# Altium footprint library pcb.PcbLib: 397 footprints (part 11 of 25)
Each footprint in its own frame and in the unit in brackets; x right, y up, seen from the top. Pads: shape width x height; smd on the part's side, far side on the other; paste and mask are expansions set on the pad; w line width, h text height; cw(c..) or ccw(c..) is an arc to the next point about the centre after c.
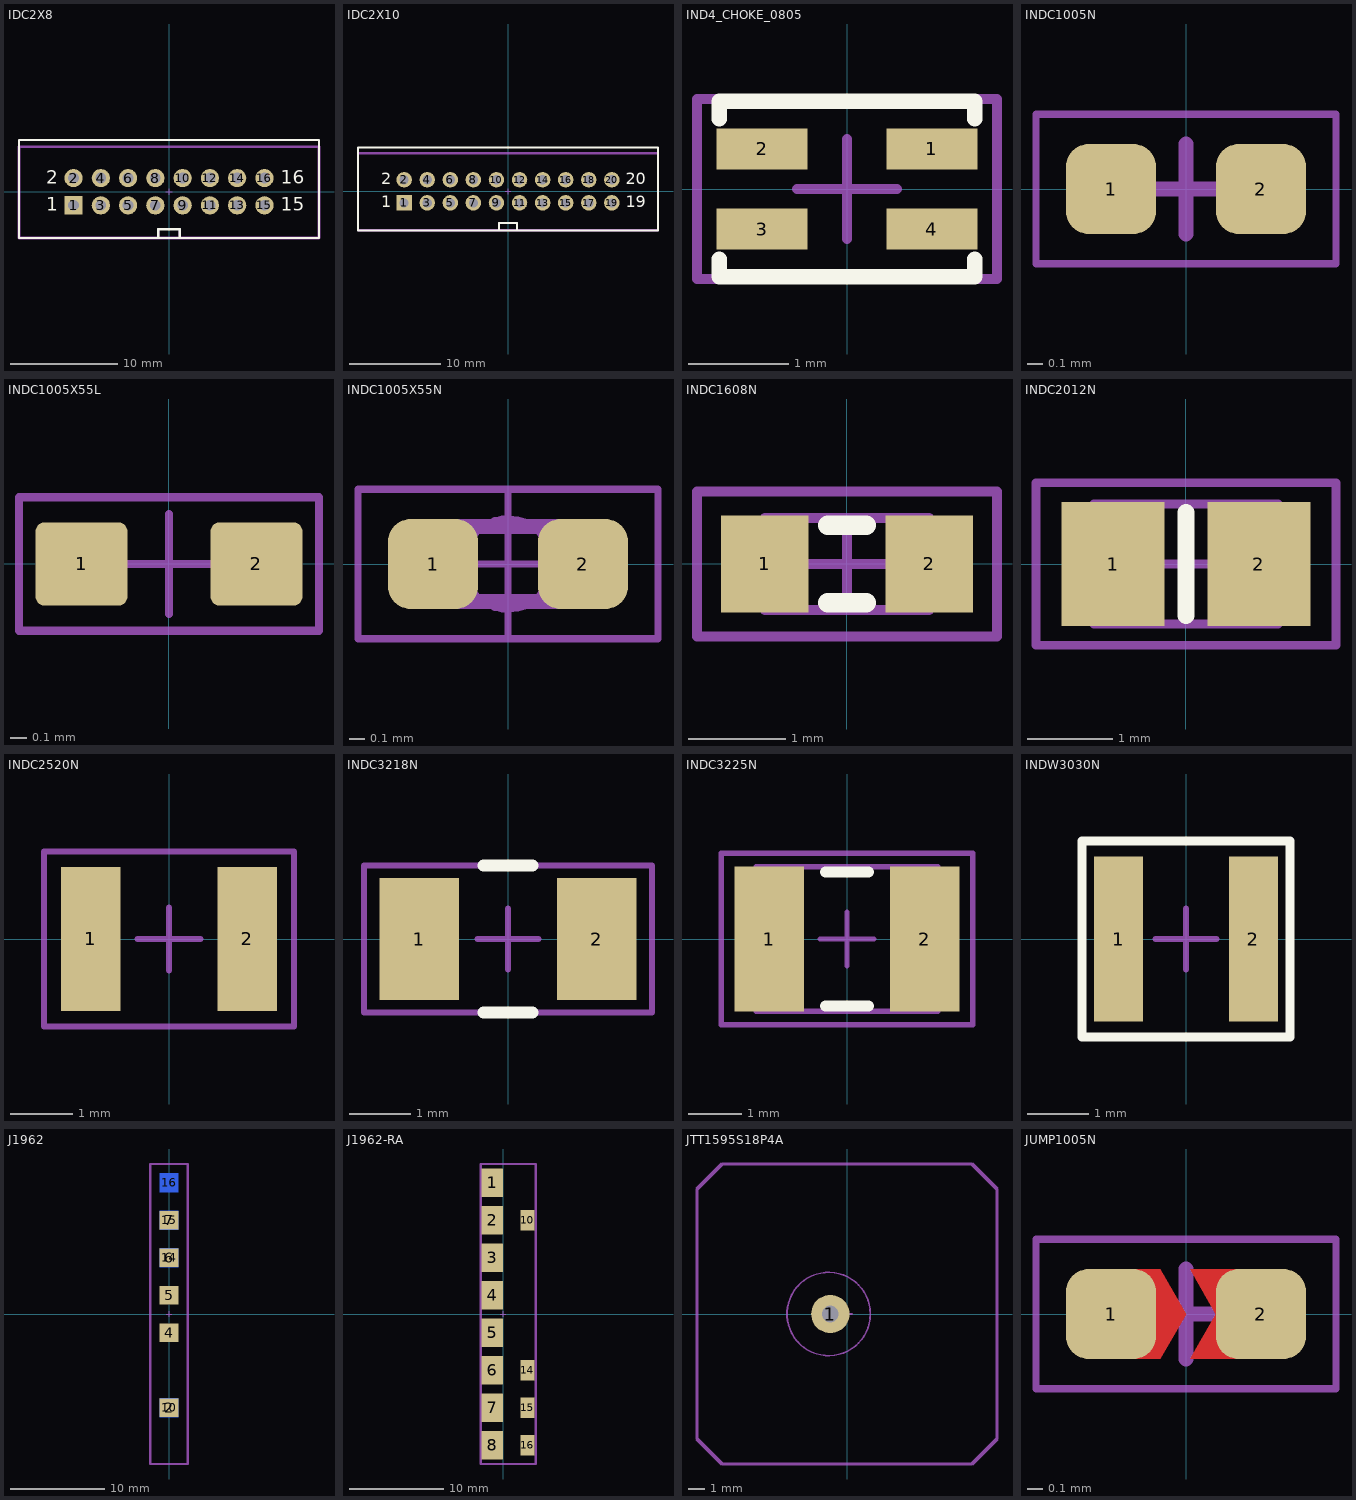
[diagram p10: the footprints below, top view; thin cyan lines are the x and y axes]

## IDC2X8 [mm] "Connector; Header; 8x2 Position"
pads (16):
  rect 1.7x1.7 hole 1: 1(-8.89,-1.27)
  round 1.7 hole 1: 2(-8.89,1.27) 3(-6.35,-1.27) 4(-6.35,1.27) 5(-3.81,-1.27) 6(-3.81,1.27) 7(-1.27,-1.27) 8(-1.27,1.27) 9(1.27,-1.27) 10(1.27,1.27) 11(3.81,-1.27) 12(3.81,1.27) 13(6.35,-1.27) 14(6.35,1.27) 15(8.89,-1.27) 16(8.89,1.27)
Top Overlay:
  lines w0.2: -1,-4.318 -1,-3.5 1,-3.5 1,-4.318 ; -13.97,-4.318 13.97,-4.318 13.97,4.826 -13.97,4.826 -13.97,-4.318
  text "2" at -11.43,0.762 h1.27
  text "1" at -11.43,-1.778 h1.27
  text "15" at 10.414,-1.778 h1.27
  text "16" at 10.414,0.762 h1.27
Mechanical 15:
  lines w0.1: -0.3,0 0.3,0 ; 0,-0.3 0,0.3
  lines w0.2: -1,-4.3 -1,-3.482 1,-3.482 1,-4.3
  lines w0.254: -13.97,-4.3 13.97,-4.3 13.97,4.2 -13.97,4.2 -13.97,-4.3
  text ".Designator" at 2.3,1.7 h1.02
  text "1" at -8.96,-1.7 h1.02
3D body "Samtec-TST-108-01-T-D.step": height 9.27, standoff -2.92, extent -13.97,-4.483 13.97,4.991

## IDC2X10 [mm] "Connector; Header; 10x2 Position"
pads (20):
  rect 1.7x1.7 hole 1: 1(-11.43,-1.27)
  round 1.7 hole 1: 2(-11.43,1.27) 3(-8.89,-1.27) 4(-8.89,1.27) 5(-6.35,-1.27) 6(-6.35,1.27) 7(-3.81,-1.27) 8(-3.81,1.27) 9(-1.27,-1.27) 10(-1.27,1.27) 11(1.27,-1.27) 12(1.27,1.27) 13(3.81,-1.27) 14(3.81,1.27) 15(6.35,-1.27) 16(6.35,1.27) 17(8.89,-1.27) 18(8.89,1.27) 19(11.43,-1.27) 20(11.43,1.27)
Top Overlay:
  lines w0.2: -1,-4.318 -1,-3.5 1,-3.5 1,-4.318 ; -16.51,-4.318 -16.51,4.826 16.51,4.826 16.51,-4.318 -16.51,-4.318
  text "20" at 12.954,0.762 h1.27
  text "19" at 12.954,-1.778 h1.27
  text "1" at -13.97,-1.778 h1.27
  text "2" at -13.97,0.762 h1.27
Mechanical 15:
  lines w0.1: -0.3,0 0.3,0 ; 0,-0.3 0,0.3
  lines w0.2: -1,-4.3 -1,-3.482 1,-3.482 1,-4.3
  lines w0.254: -16.51,-4.3 -16.51,4.2 16.51,4.2 16.51,-4.3 -16.51,-4.3
  text "1" at -11.5,-1.7 h1.02
  text ".Designator" at 2.3,1.7 h1.02
3D body "TST-110-01-X-D.step": height 9.27, standoff -2.92, extent -16.51,-4.572 16.51,4.902

## IND4_CHOKE_0805 [mil] "IND4_CHOKE_0805"
pads (4):
  rect 36x16 smd: 1(33.46,15.75) 2(-33.46,15.75) 3(-33.46,-15.75) 4(33.46,-15.75)
Top Overlay:
  lines w6: -50.31,-27.56 -50.31,-34.56 50.31,-34.56 50.31,-27.56 ; -50.31,27.56 -50.31,34.56 50.31,34.56 50.31,27.56
Mechanical 15:
  lines w3.94: -19.69,0 19.68,0 ; 0,-19.69 0,19.68 ; -59.06,-35.43 59.06,-35.43 59.06,35.43 -59.06,35.43 -59.06,-35.43
  text ".Designator" at -51.18,-27.56 h30
3D body: height 39.37, standoff 0, extent -51.46,-27.56 51.46,27.56

## INDC1005N [mm] "Chip Inductor, Body 1.0x0.5mm, IPC Medium Density"
height 0.6
pads (2):
  rrect50% 0.6x0.6 smd: 1(-0.5,0) 2(0.5,0)
Mechanical 15:
  lines w0.05: -1,-0.5 1,-0.5 1,0.5 -1,0.5 -1,-0.5
  lines w0.1: -0.3,0 0.3,0 ; 0,-0.3 0,0.3
  text ".Designator" at -0.9,-0.4 h0.3
3D body: height 0.5, standoff 0, extent -0.5,-0.25 0.5,0.25

## INDC1005X55L [mm] "Chip Inductor, Body 1.0x0.5mm, IPC Medium Density"
height 0.55
pads (2):
  rrect20% 0.55x0.5 smd mask+0.06: 1(-0.525,0) 2(0.525,0)
Mechanical 15:
  lines w0.05: -0.3,0 0.3,0 ; 0,-0.3 0,0.3 ; -0.9,-0.4 -0.9,0.4 0.9,0.4 0.9,-0.4 -0.9,-0.4
  text ".Designator" at -0.8,-0.3 h0.3
3D body: height 0.55, standoff 0, extent -0.5,-0.25 0.5,0.25

## INDC1005X55N [mm] "Chip Inductor, Body 1.0x0.5mm, IPC Medium Density"
height 0.55
pads (2):
  rrect50% 0.6x0.6 smd: 1(-0.5,0) 2(0.5,0)
Mechanical 13:
  lines w0.1: -0.5,-0.25 0.5,-0.25 0.5,0.25 -0.5,0.25 -0.5,-0.25
Mechanical 15:
  circle w0.05: c0,0 r0.3
  lines w0.05: -0.475,0 0.475,0 ; 0,-0.475 0,0.475 ; -1,-0.5 -1,0.5 1,0.5 1,-0.5 -1,-0.5
  text ".Designator" at -0.9,-0.4 h0.3
3D body: height 0.55, standoff 0, extent -0.5,-0.25 0.5,0.25

## INDC1608N [mm] "Chip Inductor, Body 1.6x0.8mm, IPC Medium Density"
height 0.6
pads (2):
  rect 0.9x1 smd: 1(-0.85,0) 2(0.85,0)
Top Overlay:
  lines w0.2: -0.2,-0.4 0.2,-0.4 ; -0.2,0.4 0.2,0.4
Mechanical 13:
  lines w0.1: -0.85,-0.475 -0.85,0.475 0.85,0.475 0.85,-0.475 -0.85,-0.475
Mechanical 15:
  lines w0.1: -0.475,0 0.475,0 ; 0,-0.475 0,0.475 ; -1.55,-0.75 -1.55,0.75 1.55,0.75 1.55,-0.75 -1.55,-0.75
  text ".Designator" at -1.372,-0.61 h0.51
3D body: height 0.6, standoff 0, extent -0.85,-0.475 0.85,0.475

## INDC2012N [mm] "Chip Inductor, Body 2.0x1.3mm, IPC Medium Density"
height 1.3
pads (2):
  rect 1.2x1.45 smd: 1(-0.85,0) 2(0.85,0)
Top Overlay:
  lines w0.2: 0,-0.6 0,0.6
Mechanical 13:
  lines w0.1: -1.075,-0.7 1.075,-0.7 1.075,0.7 -1.075,0.7 -1.075,-0.7
Mechanical 15:
  lines w0.1: -0.5,0 0.5,0 ; 0,-0.5 0,0.5 ; -1.75,-0.95 1.75,-0.95 1.75,0.95 -1.75,0.95 -1.75,-0.95
  text ".Designator" at -1.422,-0.762 h0.51
3D body: height 0.65, standoff 0, extent -1.075,-0.7 1.075,0.7

## INDC2520N [mm] "Chip Inductor, Body 2.5x2.0mm, IPC Medium Density"
height 2.2
pads (2):
  rect 0.95x2.3 smd: 1(-1.25,0) 2(1.25,0)
Mechanical 15:
  lines w0.1: -0.5,0 0.5,0 ; 0,-0.5 0,0.5 ; -2,-1.4 -2,1.4 2,1.4 2,-1.4 -2,-1.4
  text ".Designator" at -1.422,-0.762 h0.51
3D body: height 0.65, standoff 0, extent -1.3,-1 1.3,1

## INDC3218N [mm] "Chip Inductor, Body 3.2x1.8mm, IPC Medium Density"
height 1
pads (2):
  rect 1.3x2 smd: 1(-1.45,0) 2(1.45,0)
Top Overlay:
  lines w0.2: -0.4,-1.2 0.4,-1.2 ; -0.4,1.2 0.4,1.2
Mechanical 15:
  lines w0.1: -0.5,0 0.5,0 ; 0,-0.5 0,0.5 ; -2.35,-1.2 2.35,-1.2 2.35,1.2 -2.35,1.2 -2.35,-1.2
  text ".Designator" at -2.055,-1.067 h0.51
3D body: height 1.5, standoff 0, extent -1.7,-1 1.7,1

## INDC3225N [mm] "Chip Inductor, Body 3.2x2.5mm, IPC Medium Density"
height 1.5
pads (2):
  rect 1.3x2.7 smd: 1(-1.45,0) 2(1.45,0)
Top Overlay:
  lines w0.2: -0.4,-1.25 0.4,-1.25 ; -0.4,1.25 0.4,1.25
Mechanical 13:
  lines w0.1: -1.7,-1.35 1.7,-1.35 1.7,1.35 -1.7,1.35 -1.7,-1.35
Mechanical 15:
  lines w0.1: -0.5,0 0.5,0 ; 0,-0.5 0,0.5 ; -2.35,-1.6 2.35,-1.6 2.35,1.6 -2.35,1.6 -2.35,-1.6
  text ".Designator" at -2.055,-1.067 h0.51
3D body: height 1.5, standoff 0, extent -1.7,-1.35 1.7,1.35

## INDW3030N [mm] "Inductor, Body 3.0x3.0mm, IPC Medium Density"
height 1.2
pads (2):
  rect 0.8x2.7 smd: 1(-1.1,0) 2(1.1,0)
Top Overlay:
  lines w0.15: -1.7,-1.6 -1.7,1.6 1.7,1.6 1.7,-1.6 -1.7,-1.6
Mechanical 15:
  lines w0.1: -0.5,0 0.5,0 ; 0,-0.5 0,0.5 ; -1.7,-1.6 1.7,-1.6 1.7,1.6 -1.7,1.6 -1.7,-1.6
  text ".Designator" at -1.5,-1.4 h0.51
3D body: height 1.2, standoff 0, extent -1.6,-1.6 1.6,1.6

## J1962 [mm] "J1962, male"
height 2
pads (9):
  rect 2x2 smd: 2(0,-10) 4(0,-2) 5(0,2) 6(0,6) 7(0,10)
  rect 2x2 smd far side: 10(0,-10) 14(0,6) 15(0,10) 16(0,14)
Mechanical 15:
  lines w0.1: -0.3,0 0.3,0 ; 0,-0.3 0,0.3
  lines w0.254: -2,-16 -2,16 2,16 2,-16 -2,-16
  text "pcb_edge" at -2,16 h1.02
  text ".Designator" at 0,-8 h1.02
3D body: height 3, standoff 0, extent -1,-3 1,-1
3D body: height 3, standoff 0, extent -1,-11 1,-9
3D body: height 3, standoff 0, extent -1,1 1,3
3D body: height 3, standoff 0, extent -1,5 1,7
3D body: height 3, standoff 0, extent -1,9 1,11
3D body: height 3, standoff 0, extent -1,-11 1,-9
3D body: height 3, standoff 0, extent -1,5 1,7
3D body: height 3, standoff 0, extent -1,9 1,11
3D body: height 3, standoff 0, extent -1,13 1,15

## J1962-RA [mm] "J1962, male"
height 2
pads (12):
  rect 2.3x3 smd: 1(-1.15,14) 2(-1.15,10) 3(-1.15,6) 4(-1.15,2) 5(-1.15,-2) 6(-1.15,-6) 7(-1.15,-10) 8(-1.15,-14)
  rect 1.5x2.2 smd: 10(2.6,10) 14(2.6,-6) 15(2.6,-10) 16(2.6,-14)
Mechanical 15:
  lines w0.1: -0.3,0 0.3,0 ; 0,-0.3 0,0.3
  lines w0.254: -2.4,-16 3.5,-16 3.5,16 -2.4,16 -2.4,-16
  text ".Designator" at 1.9,-3.4 h1.02
  text "pcb_edge" at -2,16 h1.02
3D body "COMTECH_OBD-II-16M-E-N-12V_RA2.stp": height 15.36, standoff -3.55, extent -23.2,-20.275 2.95,20.275

## JTT1595S18P4A [mm] "18x18x4 Ceramic GPS antenna"
height 4
pads (1):
  round 2.3 hole 1: 1(-1,0)
Mechanical 15:
  lines w0.1: -0.3,0 0.3,0 ; 0,-0.3 0,0.3
  lines w0.2: -9,-7.5 -9,7.5 -7.5,9 7.5,9 9,7.5 9,-7.5 7.5,-9 -7.5,-9 -9,-7.5
  text ".Designator" at -6.8,-5.7 h1.02
Mechanical 16:
  circle w0.1: c-1.1,0 r2.5
3D body: height 4, standoff 0, extent -9,-9 9,9

## JUMP1005N [mm] "JUMPER"
height 0.6
pads (2):
  rrect50% 0.6x0.6 smd: 1(-0.5,0) 2(0.5,0)
Top Layer:
  region: -0.5,0.3 -0.171,0.3 0,0 -0.171,-0.3 -0.5,-0.3
  region: 0.4,0.3 0.029,0.3 0.2,0 0.029,-0.3 0.4,-0.3
Top Solder:
  rectangle: -0.5,-0.4 0.5,0.4
Mechanical 15:
  lines w0.05: -1,-0.5 1,-0.5 1,0.5 -1,0.5 -1,-0.5
  lines w0.1: -0.3,0 0.3,0 ; 0,-0.3 0,0.3
  text ".Designator" at -0.9,-0.4 h0.3
3D body: height 0.5, standoff 0, extent -0.5,-0.25 0.5,0.25